# Altium footprint library LimeMicroAltiumLib.PcbLib: 760 footprints (part 8 of 50)
Each footprint in its own frame and in the unit in brackets; x right, y up, seen from the top. Pads: shape width x height; smd on the part's side, far side on the other; paste and mask are expansions set on the pad; w line width, h text height; cw(c..) or ccw(c..) is an arc to the next point about the centre after c.
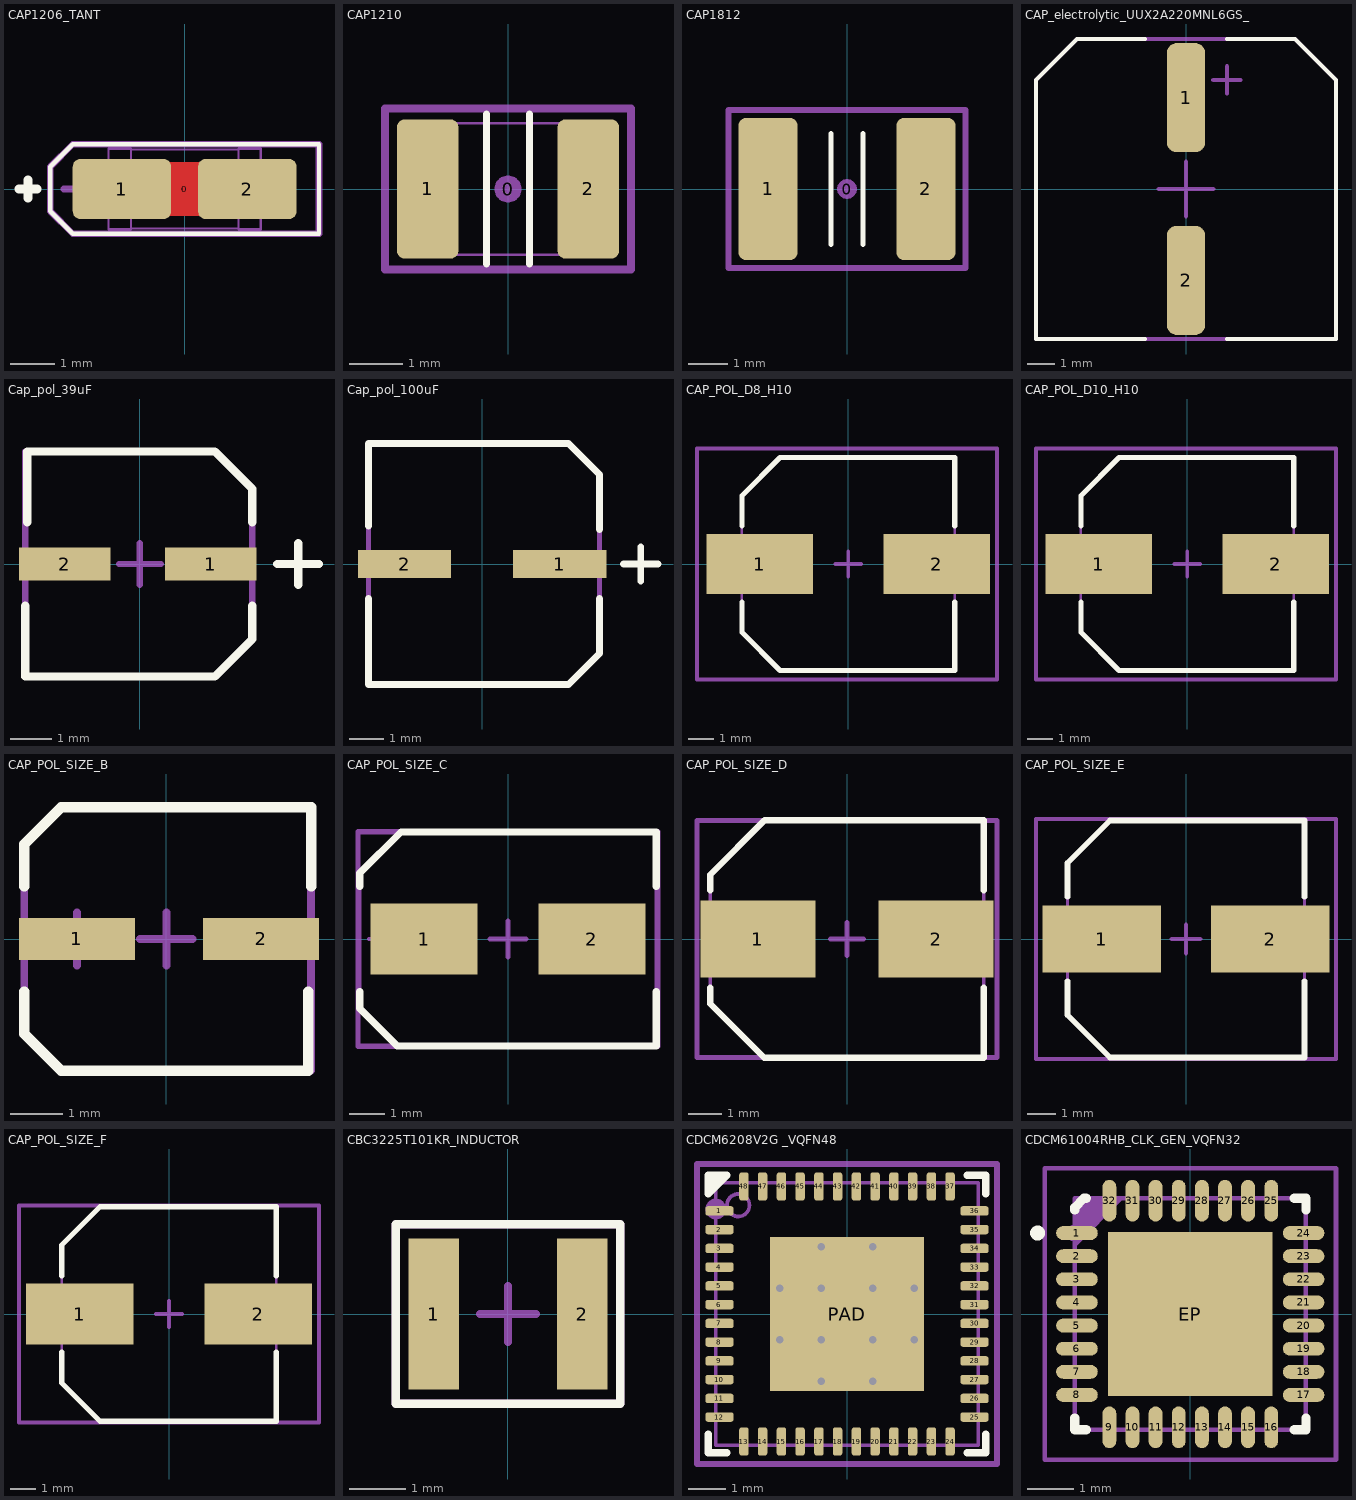
[diagram p7: the footprints below, top view; thin cyan lines are the x and y axes]

## CAP1206_TANT [mm] "Chip Capacitor, Body 1.6x0.8mm, 0603, IPC Medium Density"
height 0.8
pads (3):
  round 0.254 on Mech15: 0(0,0)
  rrect25% 2.2x1.35 smd: 1(-1.4,0) 2(1.4,0)
Top Layer:
  pour cut-out: -0.4,0.6 0.4,0.6 0.4,-0.6 -0.4,-0.6
Top Overlay:
  lines w0.1: -3,-0.5 -2.5,-1 3,-1 3,1 -2.5,1 -3,0.5 -3,-0.5
  lines w0.2: -3.7,0 -3.3,0 ; -3.5,-0.2 -3.5,0.2
Mechanical 13:
  lines w0.05: -1.2,-0.88 1.2,-0.88 ; -1.2,0.88 1.2,0.88 ; -1.7,-0.9 -1.2,-0.9 -1.2,0.9 -1.7,0.9 -1.7,-0.9 ; 1.2,-0.9 1.7,-0.9 1.7,0.9 1.2,0.9 1.2,-0.9
Mechanical 15:
  lines w0.15: -2.7,0 -1.7,0 ; -2.2,-0.5 -2.2,0.5 ; -3,-0.5 -3,0.5 -2.5,1 3,1 3,-1 -2.5,-1 -3,-0.5
  text ".Designator" at 0,0 h0.55
3D body "CAP_1206.STEP": height 1.74, standoff -0.01, extent -1.7,-0.9 1.7,0.9

## CAP1210 [mm] "Chip Capacitor, Body 3.2x2.5mm, 1210, IPC Medium Density"
height 1.6
pads (3):
  round 0.508 on Mech15: 0(0,0)
  rrect25% 1.15x2.6 smd: 1(-1.5,0) 2(1.5,0)
Top Overlay:
  lines w0.127: -0.4,-1.4 -0.4,1.4 ; 0.4,-1.4 0.4,1.4
Mechanical 13:
  lines w0.05: -1.2,-1.25 -1.6,-1.25 -1.6,1.25 -1.2,1.25 ; 1.2,-1.25 1.6,-1.25 1.6,1.25 1.2,1.25 ; -1.2,-1.23 -1.2,1.23 1.2,1.23 1.2,-1.23 -1.2,-1.23
Mechanical 15:
  lines w0.15: -2.3,-1.5 2.3,-1.5 2.3,1.5 -2.3,1.5 -2.3,-1.5
  text ".Designator" at 0,0 h0.55
3D body "User Library-CAPC3225X13.step": height 1.29, standoff -0.01, extent -1.6,-1.25 1.6,1.25

## CAP1812 [mm] "Chip Capacitor, Body 3.2x2.5mm, 1210, IPC Medium Density"
height 1.6
pads (3):
  round 0.508 on Mech15: 0(0,0)
  rrect25% 1.5x3.6 smd: 1(-2,0) 2(2,0)
Top Overlay:
  lines w0.127: -0.4,-1.4 -0.4,1.4 ; 0.4,-1.4 0.4,1.4
Mechanical 15:
  lines w0.15: -3,-2 -3,2 3,2 3,-2 -3,-2
  text ".Designator" at 0,0 h0.55
3D body "C1812C102KGRACTU.step": height 1.54, standoff -0.01, extent -2.4,-1.7 2.4,1.8

## CAP_electrolytic_UUX2A220MNL6GS_ [mm] "22uF 100V"
pads (2):
  rrect50% 1.4x4 smd mask+0.05: 1(0,3.35) 2(0,-3.35)
Top Overlay:
  lines w0.15: -1.5,-5.5 -5.5,-5.5 -5.5,4 -4,5.5 -1.5,5.5 ; 1.5,-5.5 5.5,-5.5 5.5,4 4,5.5 1.5,5.5
Mechanical 15:
  lines w0.15: -1,0 1,0 ; 0,-1 0,1 ; 1,4 2,4 ; 1.5,3.5 1.5,4.5 ; -5.5,-5.5 5.5,-5.5 5.5,4 4,5.5 -4,5.5 -5.5,4 -5.5,-5.5
  text ".Designator" at 0,0 h0.55
3D body "User Library-AL_EL_cap_8mmx10mm.STEP": height 10.3, standoff -0.2, extent -4.25,-4.848 4.25,4.852

## Cap_pol_39uF [mm]
pads (2):
  rect 2.2x0.8 smd: 1(1.7,0) 2(-1.8,0)
Top Overlay:
  lines w0.2: -2.75,-1 -2.75,-2.7 1.8,-2.7 2.7,-1.8 2.7,-1 ; -2.7,1 -2.7,2.7 1.8,2.7 2.7,1.8 2.7,1 ; 3.3,0 4.3,0 ; 3.8,-0.5 3.8,0.5
Mechanical 15:
  lines w0.15: -0.5,0 0.5,0 ; 0,-0.5 0,0.5 ; 3.3,0 4.3,0 ; 3.8,-0.5 3.8,0.5 ; -2.75,-2.7 -2.75,2.7 1.8,2.7 2.7,1.8 2.7,-1.8 1.8,-2.7 -2.75,-2.7
  text ".Designator" at 0,0 h0.55
3D body: height 2, standoff 0, extent -2.65,-2.65 2.65,2.65
3D body: height 6, standoff 0, extent -2.232,-2.241 2.25,2.25

## Cap_pol_100uF [mm]
pads (2):
  rect 2.7x0.8 smd: 1(2.25,0) 2(-2.25,0)
Top Overlay:
  lines w0.2: -3.3,-1 -3.3,-3.5 2.5,-3.5 3.4,-2.6 3.4,-1 ; -3.3,1.1 -3.3,3.5 2.5,3.5 3.4,2.6 3.4,1 ; 4.1,0 5.1,0 ; 4.6,-0.5 4.6,0.5
Mechanical 15:
  lines w0.15: 4.1,0 5.1,0 ; 4.6,-0.5 4.6,0.5 ; -3.3,-3.5 -3.3,-1 -3.3,3.5 2.5,3.5 3.4,2.6 3.4,-2.6 2.5,-3.5 -3.3,-3.5
  text ".Designator" at 0,0 h0.55

## CAP_POL_D8_H10 [mm] "Aluminum Electrolytic Capacitor, Body 8,30x8,30x10,50mm, IPC Low Density"
height 10.5
pads (2):
  rect 4.15x2.35 smd: 1(-3.45,0) 2(3.45,0)
Top Overlay:
  lines w0.2: -4.15,-1.475 -4.15,-2.663 -2.663,-4.15 4.15,-4.15 4.15,-1.475 ; -4.15,1.475 -4.15,2.662 -2.663,4.15 4.15,4.15 4.15,1.475
Mechanical 13:
  lines w0.1: -4.15,-2.663 -2.663,-4.15 4.15,-4.15 4.15,4.15 -2.663,4.15 -4.15,2.662 -4.15,-2.663
Mechanical 15:
  lines w0.15: -0.5,0 0.5,0 ; 0,-0.5 0,0.5 ; -5.9,-4.5 -5.9,4.5 5.8,4.5 5.8,-4.5 -5.9,-4.5
  text ".Designator" at 0,0 h0.55
3D body: height 3.5, standoff 0, extent -4.15,-4.15 4.15,4.15
3D body: height 10.5, standoff 0, extent -4,-4 3.968,3.984

## CAP_POL_D10_H10 [mm] "Aluminum Electrolytic Capacitor, Body 8,30x8,30x10,50mm, IPC Low Density"
height 10.5
pads (2):
  rect 4.15x2.35 smd: 1(-3.45,0) 2(3.45,0)
Top Overlay:
  lines w0.2: -4.15,-1.475 -4.15,-2.663 -2.663,-4.15 4.15,-4.15 4.15,-1.475 ; -4.15,1.475 -4.15,2.662 -2.663,4.15 4.15,4.15 4.15,1.475
Mechanical 13:
  lines w0.1: -4.15,-2.663 -4.15,2.662 -2.663,4.15 4.15,4.15 4.15,-4.15 -2.663,-4.15 -4.15,-2.663
Mechanical 15:
  lines w0.15: -0.5,0 0.5,0 ; 0,-0.5 0,0.5 ; -5.9,-4.5 5.8,-4.5 5.8,4.5 -5.9,4.5 -5.9,-4.5
  text ".Designator" at 0,0 h0.55
3D body: height 10.5, standoff 0, extent -4,-4 3.968,3.984
3D body: height 3.5, standoff 0, extent -4.15,-4.15 4.15,4.15

## CAP_POL_SIZE_B [mm]
height 10.5
pads (2):
  rect 2.2x0.8 smd: 1(-1.7,0) 2(1.8,0)
Top Overlay:
  lines w0.2: -2.7,-1 -2.7,-1.8 -2,-2.5 2.7,-2.5 2.7,-1 ; -2.7,1 -2.7,1.8 -2,2.5 2.75,2.5 2.75,1
Mechanical 15:
  lines w0.15: -2.2,0 -1.2,0 ; -1.7,-0.5 -1.7,0.5 ; -0.5,0 0.5,0 ; 0,-0.5 0,0.5 ; -2.7,-1.8 -2.7,1.8 -2,2.5 2.75,2.5 2.75,-2.5 -2,-2.5 -2.7,-1.8
  text ".Designator" at 0,0 h0.55
3D body "â¦4 SIZE CODE B.stp": height 5.8, standoff 0, extent -2.5,-2.15 2.5,2.15

## CAP_POL_SIZE_C [mm]
height 10.5
pads (2):
  rect 3x2 smd: 1(-2.35,0) 2(2.35,0)
Top Overlay:
  lines w0.2: -4.15,-1.475 -4.15,-1.95 -3.1,-3 4.15,-3 4.15,-1.475 ; -4.15,1.475 -4.15,1.85 -3,3 4.15,3 4.15,1.475
Mechanical 13:
  lines w0.1: -4.15,-1.95 -4.15,1.85 -3,3 4.15,3 4.15,-3 -3.1,-3 -4.15,-1.95
Mechanical 15:
  lines w0.1: -3.9,0 -2.4,0 ; -3.15,-0.75 -3.15,0.75
  lines w0.15: -0.5,0 0.5,0 ; 0,-0.5 0,0.5 ; -4.2,-3 4.2,-3 4.2,3 -4.2,3 -4.2,-3
  text ".Designator" at 0,0 h0.55
3D body "User Library-capacitor size C.step": height 5.41, standoff -0.01, extent -2.95,-2.65 2.95,2.65

## CAP_POL_SIZE_D [mm]
height 10.5
pads (2):
  rect 3.5x2.35 smd: 1(-2.7,0) 2(2.7,0)
Top Overlay:
  lines w0.2: -4.15,-1.475 -4.15,-1.962 -2.512,-3.6 4.15,-3.6 4.15,-1.475 ; -4.15,1.475 -4.15,1.95 -2.5,3.6 4.15,3.6 4.15,1.475
Mechanical 13:
  lines w0.1: -4.15,-1.95 -4.15,1.95 -2.5,3.6 4.15,3.6 4.15,-3.6 -2.5,-3.6 -4.15,-1.95
Mechanical 15:
  lines w0.1: -3.65,0 -2.15,0 ; -2.9,-0.75 -2.9,0.75
  lines w0.15: -0.5,0 0.5,0 ; 0,-0.5 0,0.5 ; -4.55,-3.6 4.55,-3.6 4.55,3.6 -4.55,3.6 -4.55,-3.6
  text ".Designator" at 0,0 h0.55
3D body "EDK476M035A9GAA.step": height 5.66, standoff 0, extent -3.8,-3.4 3.8,3.4

## CAP_POL_SIZE_E [mm]
height 10.5
pads (2):
  rect 4.15x2.35 smd: 1(-2.95,0) 2(2.95,0)
Top Overlay:
  lines w0.2: -4.15,-1.475 -4.15,-2.663 -2.663,-4.15 4.15,-4.15 4.15,-1.475 ; -4.15,1.475 -4.15,2.662 -2.663,4.15 4.15,4.15 4.15,1.475
Mechanical 13:
  lines w0.1: -4.15,-2.663 -2.663,-4.15 4.15,-4.15 4.15,4.15 -2.663,4.15 -4.15,2.662 -4.15,-2.663
Mechanical 15:
  lines w0.1: -4.9,0 -3.4,0 ; -4.15,-0.75 -4.15,0.75
  lines w0.15: -0.5,0 0.5,0 ; 0,-0.5 0,0.5 ; -5.25,-4.2 -5.25,4.2 5.25,4.2 5.25,-4.2 -5.25,-4.2
  text ".Designator" at 0,0 h0.55
3D body "User Library-capacitor size E.step": height 6.2, standoff -0.01, extent -4.5,-4.15 4.5,4.15

## CAP_POL_SIZE_F [mm]
height 10.5
pads (2):
  rect 4.15x2.35 smd: 1(-3.45,0) 2(3.45,0)
Top Overlay:
  lines w0.2: -4.15,-1.475 -4.15,-2.663 -2.663,-4.15 4.15,-4.15 4.15,-1.475 ; -4.15,1.475 -4.15,2.662 -2.663,4.15 4.15,4.15 4.15,1.475
Mechanical 13:
  lines w0.1: -4.15,-2.663 -4.15,2.662 -2.663,4.15 4.15,4.15 4.15,-4.15 -2.663,-4.15 -4.15,-2.663
Mechanical 15:
  lines w0.1: -4.9,0 -3.4,0 ; -4.15,-0.75 -4.15,0.75
  lines w0.15: -0.5,0 0.5,0 ; 0,-0.5 0,0.5 ; -5.8,-4.2 5.8,-4.2 5.8,4.2 -5.8,4.2 -5.8,-4.2
  text ".Designator" at 0,0 h0.55
3D body "User Library-capacitor size F.step": height 10.21, standoff -0.01, extent -4.95,-4.15 4.95,4.15

## CBC3225T101KR_INDUCTOR [mm] "Power inductor CBC3225T101KR, 0.34A"
pads (2):
  rect 0.9x2.7 smd mask+0.05: 1(-1.325,0) 2(1.325,0)
Top Overlay:
  lines w0.15: -2,-1.6 2,-1.6 2,1.6 -2,1.6 -2,-1.6
Mechanical 15:
  lines w0.15: -0.5,0 0.5,0 ; 0,-0.5 0,0.5 ; -2,-1.6 2,-1.6 2,1.6 -2,1.6 -2,-1.6
  text ".Designator" at 0,0 h0.55
  text "No polarity" at -1.6,-1.3 h0.3
3D body "User Library-CBC3225.step": height 2.5, standoff 0, extent -1.575,-1.25 1.625,1.25

## CDCM6208V2G _VQFN48 [mm] "48-VQFN package 7x7 mm"
pads (49):
  rrect50% 0.75x0.25 smd mask+0.05: 1(-3.4,2.75) 2(-3.4,2.25) 3(-3.4,1.75) 4(-3.4,1.25) 5(-3.4,0.75) 6(-3.4,0.25) 7(-3.4,-0.25) 8(-3.4,-0.75) 9(-3.4,-1.25) 10(-3.4,-1.75) 11(-3.4,-2.25) 12(-3.4,-2.75) 25(3.4,-2.75) 26(3.4,-2.25) 27(3.4,-1.75) 28(3.4,-1.25) 29(3.4,-0.75) 30(3.4,-0.25) 31(3.4,0.25) 32(3.4,0.75) 33(3.4,1.25) 34(3.4,1.75) 35(3.4,2.25) 36(3.4,2.75)
  rrect50% 0.25x0.75 smd mask+0.05: 13(-2.75,-3.4) 14(-2.25,-3.4) 15(-1.75,-3.4) 16(-1.25,-3.4) 17(-0.75,-3.4) 18(-0.25,-3.4) 19(0.25,-3.4) 20(0.75,-3.4) 21(1.25,-3.4) 22(1.75,-3.4) 23(2.25,-3.4) 24(2.75,-3.4) 37(2.75,3.4) 38(2.25,3.4) 39(1.75,3.4) 40(1.25,3.4) 41(0.75,3.4) 42(0.25,3.4) 43(-0.25,3.4) 44(-0.75,3.4) 45(-1.25,3.4) 46(-1.75,3.4) 47(-2.25,3.4) 48(-2.75,3.4)
  rect 4.1x4.1 smd paste-5 mask+0.05: PAD(0,0)
via 0.685,-0.685 diameter 0.4 hole 0.2
via 0.685,-1.8 diameter 0.4 hole 0.2
via 1.8,-0.685 diameter 0.4 hole 0.2
via -1.8,-0.685 diameter 0.4 hole 0.2
via -0.685,-1.8 diameter 0.4 hole 0.2
via -0.685,-0.685 diameter 0.4 hole 0.2
via -0.685,0.685 diameter 0.4 hole 0.2
via -0.685,1.8 diameter 0.4 hole 0.2
via -1.8,0.685 diameter 0.4 hole 0.2
via 1.8,0.685 diameter 0.4 hole 0.2
via 0.685,1.8 diameter 0.4 hole 0.2
via 0.685,0.685 diameter 0.4 hole 0.2
Top Overlay:
  region: -3.7,3.25 -3.25,3.7 -3.7,3.7
  lines w0.2: -3.7,-3.2 -3.7,-3.7 -3.2,-3.7 ; 3.2,-3.7 3.7,-3.7 3.7,-3.2 ; 3.2,3.7 3.7,3.7 3.7,3.2 ; -3.7,3.2 -3.7,3.7 -3.2,3.7 -3.7,3.2
Top Paste:
  drawing of 9 lines, arcs and shapes, not listed
Mechanical 13:
  circle w0.1: c-2.9,2.9 r0.3
  lines w0.1: -3.5,-3.5 -3.5,3.5 3.5,3.5 3.5,-3.5 -3.5,-3.5
Mechanical 15:
  circle w0.35: c-3.5,2.8 r0.1
  lines w0.15: -0.5,0 0.5,0 ; 0,-0.5 0,0.5 ; -4,-4 -4,4 4,4 4,-4 -4,-4
  text ".Designator" at 0,0 h0.55
3D body "ALSRobot-QFN48 7x7.step": height 0.78, standoff -0.02, extent -3.51,-3.51 3.51,3.51

## CDCM61004RHB_CLK_GEN_VQFN32 [mm]
pads (33):
  oval 0.9x0.3 smd mask+0.05: 1(-2.45,1.75) 2(-2.45,1.25) 3(-2.45,0.75) 4(-2.45,0.25) 5(-2.45,-0.25) 6(-2.45,-0.75) 7(-2.45,-1.25) 8(-2.45,-1.75) 17(2.45,-1.75) 18(2.45,-1.25) 19(2.45,-0.75) 20(2.45,-0.25) 21(2.45,0.25) 22(2.45,0.75) 23(2.45,1.25) 24(2.45,1.75)
  oval 0.3x0.9 smd mask+0.05: 9(-1.75,-2.45) 10(-1.25,-2.45) 11(-0.75,-2.45) 12(-0.25,-2.45) 13(0.25,-2.45) 14(0.75,-2.45) 15(1.25,-2.45) 16(1.75,-2.45) 25(1.75,2.45) 26(1.25,2.45) 27(0.75,2.45) 28(0.25,2.45) 29(-0.25,2.45) 30(-0.75,2.45) 31(-1.25,2.45) 32(-1.75,2.45)
  rect 3.55x3.55 smd paste-0.65 mask+0.05: EP(0,0)
Top Overlay:
  circle w0.25: c-3.3,1.75 r0.035
  lines w0.2: -2.5,-2.25 -2.5,-2.5 -2.25,-2.5 ; -2.5,2.25 -2.5,2.3 -2.3,2.5 -2.25,2.5 ; 2.25,-2.5 2.5,-2.5 2.5,-2.25 ; 2.25,2.5 2.5,2.5 2.5,2.25
Mechanical 13:
  lines w0.1: -2.5,1.5 -1.5,2.5 ; -2.5,1.6 -1.6,2.5 ; -2.5,1.7 -1.7,2.5 ; -2.5,1.8 -1.8,2.5 ; -2.5,1.9 -1.9,2.5 ; -2.5,2 -2,2.5 ; -2.5,2.1 -2.1,2.5 ; -2.5,2.2 -2.2,2.5 ; -2.5,2.3 -2.3,2.5 ; -2.5,2.4 -2.4,2.5 ; -2.5,-2.5 2.5,-2.5 2.5,2.5 -2.5,2.5 -2.5,-2.5
Mechanical 15:
  circle w0.2: c-2.525,1.75 r0.071
  lines w0.1: -0.5,0 0.5,0 ; 0,-0.5 0,0.5 ; -3.15,-3.15 3.15,-3.15 3.15,3.15 -3.15,3.15 -3.15,-3.15
  text ".Designator" at 0,0 h0.55
3D body "QFN50P500X500X100-33N-S355.stp": height 1, standoff 0, extent -2.5,-2.5 2.5,2.5